# Altium footprint library transistors.PcbLib: 40 footprints (part 1 of 3)
Each footprint in its own frame and in the unit in brackets; x right, y up, seen from the top. Pads: shape width x height; smd on the part's side, far side on the other; paste and mask are expansions set on the pad; w line width, h text height; cw(c..) or ccw(c..) is an arc to the next point about the centre after c.
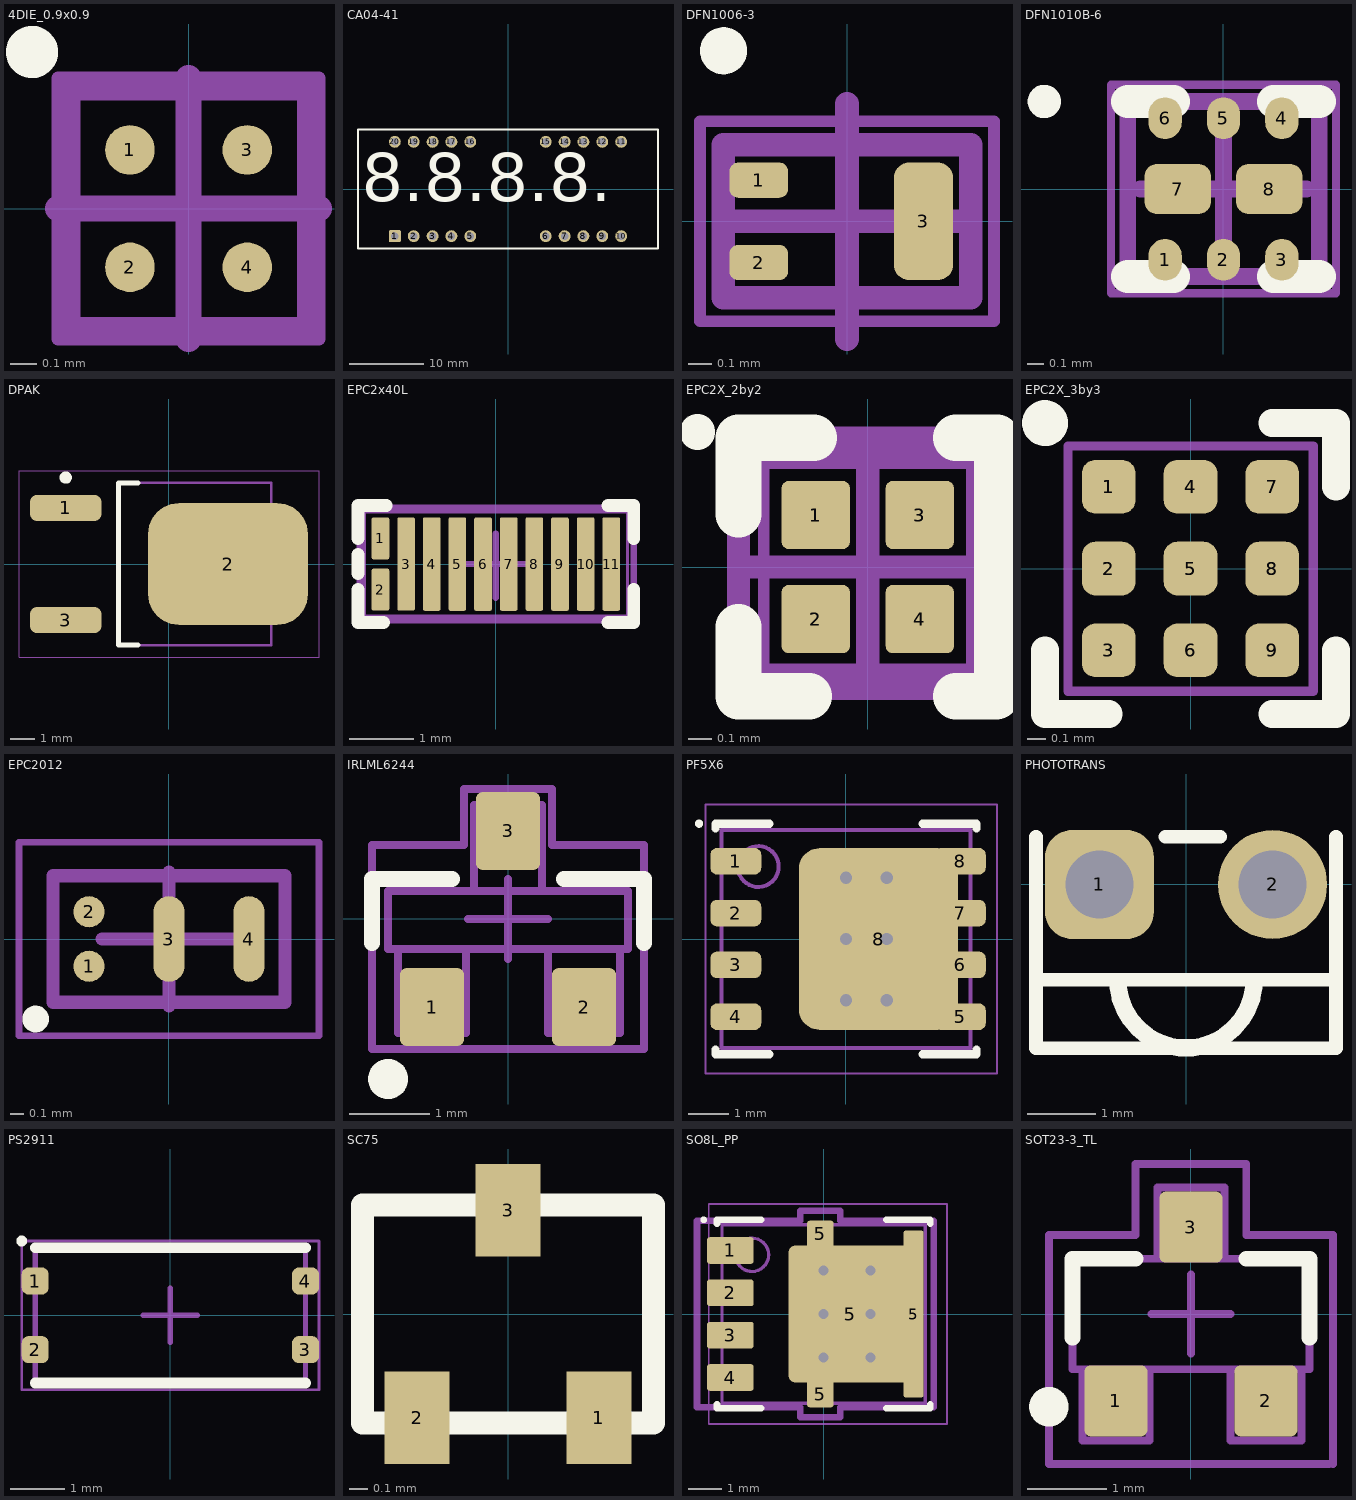
[diagram p0: the footprints below, top view; thin cyan lines are the x and y axes]

## 4DIE_0.9x0.9 [mm] "BGA, 4-Leads, Body 0,93x0,93mmx0,81mm, Pitch 0,45mm"
height 0.82
pads (4):
  round 0.19 smd mask+0.025: 1(-0.225,0.225) 2(-0.225,-0.225) 3(0.225,0.225) 4(0.225,-0.225)
Top Overlay:
  circle w0.1: c-0.6,0.6 r0.05
Mechanical 13:
  lines w0.1: -0.465,-0.465 -0.465,0.465 0.465,0.465 0.465,-0.465 -0.465,-0.465
Mechanical 15:
  lines w0.05: -0.5,-0.5 -0.5,0.5 0.5,0.5 0.5,-0.5 -0.5,-0.5
  lines w0.1: -0.5,0 0.5,0 ; 0,-0.5 0,0.5
3D body: height 0.82, standoff 0.18, extent -0.465,-0.465 0.465,0.465

## CA04-41 [mm] "kingbright 0.4\" QUAD DIGIT RED GREEN YELLOW LED DISPLAY 4-Digit 7-Segment Thru-Hole Display"
height 11.4
pads (20):
  rrect20% 1.6x1.6 hole 1: 1(-15.24,-6.35)
  round 1.6 hole 1: 2(-12.7,-6.35) 3(-10.16,-6.35) 4(-7.62,-6.35) 5(-5.08,-6.35) 6(5.08,-6.35) 7(7.62,-6.35) 8(10.16,-6.35) 9(12.7,-6.35) 10(15.24,-6.35) 11(15.24,6.35) 12(12.7,6.35) 13(10.16,6.35) 14(7.62,6.35) 15(5.08,6.35) 16(-5.08,6.35) 17(-7.62,6.35) 18(-10.16,6.35) 19(-12.7,6.35) 20(-15.24,6.35)
Top Overlay:
  lines w0.254: -20.2,-8 20.2,-8 20.2,8 -20.2,8 -20.2,-8
  text "." at -18.415,-6.985 h11
  text "8.8.8.8." at -19.685,-3.81 h11
M3_comm_top:
  text ".comment" at -3.81,-5.08 h1.52
3D body "King Bright CA04-41.step": height 6.9, standoff -4.1, extent -20.2,-8 20.2,8

## DFN1006-3 [mm] "DFN, 3-Leads, IPC High Density"
height 0.55
pads (3):
  rrect50% 0.25x0.15 smd mask+0.025: 1(-0.375,0.175) 2(-0.375,-0.175)
  rrect50% 0.25x0.5 smd mask+0.025: 3(0.325,0)
Top Overlay:
  circle w0.1: c-0.525,0.725 r0.05
Mechanical 13:
  lines w0.1: -0.525,-0.325 -0.525,0.325 0.525,0.325 0.525,-0.325 -0.525,-0.325
Mechanical 15:
  lines w0.05: -0.625,-0.425 -0.625,0.425 0.625,0.425 0.625,-0.425 -0.625,-0.425
  lines w0.1: -0.5,0 0.5,0 ; 0,-0.5 0,0.5
3D body: height 0.55, standoff 0.05, extent -0.525,-0.325 0.525,0.325

## DFN1010B-6 [mm] "PQFN, 6-Leads, Body 1,15x1,05mm, Pitch 0,35mm, Thermal Pad 0,40x0,30mm, IPC High Density"
height 0.4
pads (8):
  oval 0.2x0.25 smd: 1(-0.35,-0.425) 2(0,-0.425) 3(0.35,-0.425) 4(0.35,0.425) 5(0,0.425) 6(-0.35,0.425)
  rrect50% 0.4x0.3 smd: 7(-0.275,0) 8(0.275,0)
Top Overlay:
  circle w0.1: c-1.075,0.525 r0.05
  lines w0.2: -0.575,-0.525 -0.3,-0.525 ; -0.575,0.525 -0.3,0.525 ; 0.3,-0.525 0.575,-0.525 ; 0.3,0.525 0.575,0.525
Mechanical 13:
  lines w0.1: -0.575,-0.525 -0.575,0.525 0.575,0.525 0.575,-0.525 -0.575,-0.525
Mechanical 15:
  lines w0.05: -0.675,-0.625 -0.675,0.625 0.675,0.625 0.675,-0.625 -0.675,-0.625
  lines w0.1: -0.5,0 0.5,0 ; 0,-0.5 0,0.5
3D body: height 0.4, standoff 0.04, extent -0.575,-0.525 0.575,0.525

## DPAK [mm] "DPAK, IPC"
height 2.4
pads (3):
  rrect50% 2.9x1.05 smd: 1(-4.2,2.28) 3(-4.2,-2.28)
  rrect50% 6.5x4.95 smd: 2(2.4,0)
Top Overlay:
  circle w0.25: c-4.2,3.515 r0.125
  lines w0.2: -1.25,-3.3 -2.05,-3.3 -2.05,3.3 -1.25,3.3
Mechanical 13:
  lines w0.1: -2.05,-3.3 -2.05,3.3 4.15,3.3 4.15,-3.3 -2.05,-3.3
Mechanical 15:
  lines w0.05: -6.1,-3.8 -6.1,3.8 6.1,3.8 6.1,-3.8 -6.1,-3.8
  lines w0.1: -0.5,0 0.5,0 ; 0,-0.5 0,0.5
3D body "User Library-DPAK_TO-252AA.step": height 2.37, standoff -0.03, extent -5.098,-3.367 5.002,3.367

## EPC2x40L [mm]
height 0.8
pads (22):
  rrect20% 0.275x0.655 smd paste-0.048 mask-0.275: 1(-1.8,0.401) 2(-1.8,-0.401)
  rrect20% 0.275x1.457 smd paste-0.048 mask-0.275: 3(-1.4,0) 4(-1,-0.001) 5(-0.6,-0.001) 6(-0.2,-0.001) 7(0.2,-0.001) 8(0.6,-0.001) 9(1,-0.001) 10(1.4,-0.001) 11(1.8,-0.001)
  oval 0.18x0.56 on Top Solder: ""(-1.8,-0.4) ""(-1.8,0.4)
  oval 0.18x1.362 on Top Solder: ""(-1.4,0) ""(-1,0) ""(-0.6,0) ""(-0.2,0) ""(0.2,0) ""(0.6,0) ""(1,0) ""(1.4,0) ""(1.8,0)
Top Overlay:
  lines w0.2: -2.15,-0.4 -2.15,-0.91 -1.75,-0.91 ; -2.15,-0.15 -2.15,0.15 ; -2.15,0.4 -2.15,0.91 -1.71,0.91 ; 1.75,-0.91 2.15,-0.91 2.15,-0.4 ; 1.75,0.91 2.15,0.91 2.15,0.4
M3_comm_top:
  text ".comment" at -1.4,-0.3 h1
M5_asm_top:
  lines w0.1: -2.125,-0.875 2.15,-0.875 2.15,0.875 -2.125,0.875 -2.125,-0.85 -2.125,-0.875
  text ".Designator" at -1.6,0.9 h1
M7_courtyard_top:
  lines w0.1: -0.5,0 0.5,0 ; 0,-0.525 0,0.475 ; -2.125,-0.875 2.15,-0.875 2.15,0.875 -2.125,0.875 -2.125,-0.875
Mechanical 13:
  lines w0.05: -2.052,-0.816 2.053,-0.816 2.053,0.816 -2.052,0.816 -2.052,-0.816
3D body: height 0.81, standoff 0.1, extent -2.052,-0.816 2.053,0.816

## EPC2X_2by2 [mm]
pads (8):
  rrect20% 0.295x0.295 smd paste-0.048 mask+0: 1(-0.225,0.225) 2(-0.225,-0.225) 3(0.225,0.225) 4(0.225,-0.225)
  round 0.2 on Top Solder paste+0 mask+0: 1(-0.225,0.225) 2(-0.225,-0.225) 3(0.225,0.225) 4(0.225,-0.225)
Top Overlay:
  circle w0.152: c-0.738,0.584 r0.001
  lines w0.2: -0.559,-0.559 -0.559,-0.259 ; -0.559,0.229 -0.559,0.559 -0.233,0.559 ; -0.554,-0.559 -0.254,-0.559 ; 0.381,-0.559 0.556,-0.559 ; 0.381,0.559 0.559,0.559 0.559,-0.542
M3_comm_top:
  text ".comment" at -1.4,-0.3 h1
M5_asm_top:
  lines w0.1: -0.559,-0.467 0.476,-0.467 0.518,-0.467 0.518,0.476 -0.559,0.476 -0.559,-0.467
  text ".Designator" at -1.5,0.6 h1
M7_courtyard_top:
  lines w0.1: -0.5,0 0.5,0 ; 0,-0.525 0,0.475 ; -0.559,-0.525 0.559,-0.525 0.559,0.475 0.559,0.559 0.279,0.559 -0.279,0.559 -0.559,0.559 -0.559,0.394 -0.559,-0.409 -0.559,-0.525
Mechanical 13:
  lines w0.05: -0.45,0.447 -0.447,0.45 ; -0.45,-0.45 -0.45,0.45 0.45,0.45 0.45,-0.45 -0.45,-0.45
3D body: height 0.81, standoff 0.17, extent -0.45,-0.45 0.45,0.45

## EPC2X_3by3 [mm]
pads (18):
  rrect50% 0.295x0.295 smd paste-0.048 mask+0: 1(-0.45,0.45) 2(-0.45,0) 3(-0.45,-0.45) 4(0,0.45) 5(0,0) 6(0,-0.45) 7(0.45,0.45) 8(0.45,0) 9(0.45,-0.45)
  round 0.2 on Top Solder paste+0 mask+0: 1(-0.45,0.45) 2(-0.45,0) 3(-0.45,-0.45) 4(0,0.45) 5(0,0) 6(0,-0.45) 7(0.45,0.45) 8(0.45,0) 9(0.45,-0.45)
Top Overlay:
  circle w0.152: c-0.8,0.8 r0.05
  lines w0.152: -0.8,-0.45 -0.8,-0.8 -0.45,-0.8 ; 0.45,-0.8 0.8,-0.8 0.8,-0.45 ; 0.45,0.8 0.8,0.8 0.8,0.45
Mechanical 13:
  lines w0.05: -0.675,-0.675 -0.675,0.675 0.675,0.675 0.675,-0.675 -0.675,-0.675
3D body: height 0.81, standoff 0.17, extent -0.675,-0.675 0.675,0.675

## EPC2012 [mm] "BGA, 6-Leads, Pitch 0,60mm"
height 0.82
pads (4):
  round 0.234 smd: 1(-0.6,-0.205) 2(-0.6,0.205)
  oval 0.234x0.643 smd: 3(0,0) 4(0.6,0)
Top Overlay:
  circle w0.1: c-1,-0.6 r0.05
Mechanical 13:
  lines w0.1: -0.87,-0.475 -0.87,0.475 0.87,0.475 0.87,-0.475 -0.87,-0.475
Mechanical 15:
  lines w0.05: -1.125,-0.725 -1.125,0.725 1.125,0.725 1.125,-0.725 -1.125,-0.725
  lines w0.1: -0.5,0 0.5,0 ; 0,-0.5 0,0.5
3D body: height 0.82, standoff 0.12, extent -0.87,-0.475 0.87,0.475

## IRLML6244 [mm] "MOSFET N-CH 20V 6.3A SOT-23"
height 1.1
pads (3):
  rrect20% 0.802x0.972 smd mask+0.05: 1(-0.95,-1.101) 2(0.95,-1.101) 3(0,1.101)
Top Overlay:
  circle w0.25: c-1.5,-2 r0.125
  lines w0.2: -1.7,-0.3 -1.7,0.5 -0.7,0.5 ; 0.7,0.5 1.7,0.5 1.7,-0.3
M3_comm_top:
  text ".comment" at -1.7,-0.4 h1
M5_asm_top:
  lines w0.1: -1.375,-0.375 -1.375,-1.425 -0.525,-1.425 -0.525,-0.375 ; -0.425,0.35 -0.425,1.425 0.425,1.425 0.425,0.35 ; 0.5,-0.375 0.5,-1.425 1.4,-1.425 1.4,-0.375 ; -1.5,-0.375 -1.5,0.35 1.5,0.35 1.5,-0.375 -1.5,-0.375
  text ".Designator" at -1.05,1.575 h1
M7_courtyard_top:
  lines w0.1: -0.5,0 0.5,0 ; 0,-0.5 0,0.5 ; -1.7,-1.625 1.7,-1.625 1.7,0.925 0.55,0.925 0.55,1.625 -0.55,1.625 -0.55,0.925 -1.7,0.925 -1.7,-1.625
3D body "SOT23-3.step": height 1.3, standoff 0, extent -1.5,-1.5 1.5,1.5

## PF5X6 [mm] "PSON, IPC Medium Density"
height 1.1
pads (9):
  rrect50% 1.25x0.65 smd mask+0: 1(-2.7,1.905) 2(-2.7,0.635) 3(-2.7,-0.635) 4(-2.7,-1.905) 5(2.8,-1.905) 6(2.8,-0.635) 7(2.8,0.635) 8(2.8,1.905)
  rrect25% 3.9x4.45 smd paste-2.575 mask+0: 8(0.8,0)
via 1,-1.5 diameter 0.7 hole 0.3
via 0,-1.5 diameter 0.7 hole 0.3
via 1,0 diameter 0.7 hole 0.3
via 0,0 diameter 0.7 hole 0.3
via 1,1.5 diameter 0.7 hole 0.3
via 0,1.5 diameter 0.7 hole 0.3
Top Overlay:
  circle w0.1: c-3.6,2.825 r0.05
  lines w0.2: -3.2,-2.705 -3.2,-2.825 -1.875,-2.825 ; -3.2,2.705 -3.2,2.825 -1.875,2.825 ; 1.875,-2.825 3.2,-2.825 3.2,-2.705 ; 1.875,2.825 3.2,2.825 3.2,2.705
Top Paste:
  rectangle: -1.05,1.28 0.25,2.26
  rectangle: -1.05,0.1 0.25,1.08
  rectangle: -1.05,-1.08 0.25,-0.1
  rectangle: -1.05,-2.26 0.25,-1.28
  rectangle: 0.425,1.28 1.55,2.26
  rectangle: 0.425,0.1 1.55,1.08
  rectangle: 0.425,-1.08 1.55,-0.1
  rectangle: 0.425,-2.26 1.55,-1.28
Mechanical 13:
  circle w0.1: c-2.15,1.775 r0.5
  lines w0.1: -3.05,-2.675 -3.05,2.675 3.05,2.675 3.05,-2.675 -3.05,-2.675
Mechanical 15:
  lines w0.05: -3.445,-3.3 -3.445,3.3 3.7,3.3 3.7,-3.3 -3.445,-3.3
  lines w0.1: -0.5,0 0.5,0 ; 0,-0.5 0,0.5
3D body "Power_Flat_5x6.step": height 1, standoff 0.01, extent -3.075,-2.6 3.075,2.6

## PHOTOTRANS [mm]
height 0.025
pads (2):
  rrect50% 1.6x1.6 hole 1 mask+0.127: 1(-1.27,0)
  round 1.6 hole 1 mask+0.127: 2(1.27,0)
Top Overlay:
  lines w0.2: -2.2,-1.4 2.2,-1.4 ; -2.2,0.7 -2.2,-2.4 2.2,-2.4 2.2,0.7 ; -0.3,0.7 0.5,0.7
  lines w0.254: -0.995,-1.5 ccw(c0,-1.4) 0.995,-1.5
3D body "SDP8436.stp": height 9.04, standoff -3.54, extent -2.22,-2.415 2.22,0.7

## PS2911 [mm] "KX9A, IPC Medium Density"
height 1
pads (4):
  rrect50% 0.5x0.5 smd: 1(-2.5,0.635) 2(-2.5,-0.635) 3(2.5,-0.635) 4(2.5,0.635)
Top Overlay:
  circle w0.1: c-2.75,1.375 r0.05
  lines w0.2: -2.5,-1.25 2.5,-1.25 ; -2.5,1.25 2.5,1.25
Mechanical 13:
  lines w0.1: -2.5,-1.25 -2.5,1.25 2.5,1.25 2.5,-1.25 -2.5,-1.25
Mechanical 15:
  lines w0.05: -2.75,-1.375 -2.75,1.375 2.75,1.375 2.75,-1.375 -2.75,-1.375
  lines w0.1: -0.5,0 0.5,0 ; 0,-0.5 0,0.5
3D body: height 2.1, standoff 0.01, extent -2.5,-1.25 2.5,1.25

## SC75 [mil]
pads (3):
  rect 14.02x20 smd: 1(19.68,-22.48) 2(-19.68,-22.48) 3(0,22.48)
Top Overlay:
  lines w5: -31.5,-23.62 31.5,-23.62 31.5,23.62 -31.5,23.62 -31.5,-23.62

## SO8L_PP [mm] "SQJ457EP, PSON, IPC Medium Density"
height 1.1
pads (8):
  rrect20% 1.4x0.8 smd mask+0: 1(-2.8,1.905) 2(-2.8,0.635) 3(-2.8,-0.635) 4(-2.8,-1.905)
  rrect20% 0.8x0.8 smd mask+0: 5(-0.1,-2.4) 5(-0.1,2.4)
  rrect10% 3.7x4.1 smd paste-2.575 mask+0: 5(0.8,0)
  rrect20% 0.6x5 smd mask+0: 5(2.7,0)
via 0,1.3 diameter 0.7 hole 0.3
via 1.4,1.3 diameter 0.7 hole 0.3
via 0,0 diameter 0.7 hole 0.3
via 1.4,0 diameter 0.7 hole 0.3
via 0,-1.3 diameter 0.7 hole 0.3
via 1.4,-1.3 diameter 0.7 hole 0.3
Top Overlay:
  circle w0.1: c-3.6,2.825 r0.05
  lines w0.2: -3.2,-2.705 -3.2,-2.825 -1.875,-2.825 ; -3.2,2.705 -3.2,2.825 -1.875,2.825 ; 1.875,-2.825 3.2,-2.825 3.2,-2.705 ; 1.875,2.825 3.2,2.825 3.2,2.705
Top Paste:
  rectangle: 0.425,-2.26 1.55,-1.28
  rectangle: 0.425,-1.08 1.55,-0.1
  rectangle: 0.425,0.1 1.55,1.08
  rectangle: 0.425,1.28 1.55,2.26
  rectangle: -1.05,-2.26 0.25,-1.28
  rectangle: -1.05,-1.08 0.25,-0.1
  rectangle: -1.05,0.1 0.25,1.08
  rectangle: -1.05,1.28 0.25,2.26
M3_comm_top:
  text ".comment" at -2.6,-0.7 h2
M5_asm_top:
  text ".Designator" at -2.1,0.6 h2
M7_courtyard_top:
  lines w0.2: -0.5,0 0.5,0 ; 0,-0.5 0,0.5 ; -3.8,-2.8 -0.7,-2.8 -0.7,-3.1 0.5,-3.1 0.5,-2.8 3.3,-2.8 3.3,2.8 0.5,2.8 0.5,3.1 -0.7,3.1 -0.7,2.8 -3.8,2.8 -3.8,-2.8
Mechanical 13:
  circle w0.1: c-2.15,1.775 r0.5
  lines w0.1: -3.05,-2.675 3.05,-2.675 3.05,2.675 -3.05,2.675 -3.05,-2.675
Mechanical 15:
  lines w0.05: -3.445,-3.3 3.7,-3.3 3.7,3.3 -3.445,3.3 -3.445,-3.3
  lines w0.1: -0.5,0 0.5,0 ; 0,-0.5 0,0.5
3D body "User Library-PowerPAK_SO-8L_SINGLE.STEP": height 1.07, standoff 0, extent -3.255,-2.56 2.895,2.56

## SOT23-3_TL [mm] "IRLML2803, TLV431BSN1T1G, TL431BMFDT,215, IC VREF SHUNT ADJ SOT23-3"
height 1.1
pads (3):
  rrect20% 0.8x0.9 smd mask+0.05: 1(-0.95,-1.1) 2(0.95,-1.1) 3(0,1.1)
Top Overlay:
  circle w0.25: c-1.8,-1.175 r0.125
  lines w0.2: -1.5,-0.3 -1.5,0.7 -0.7,0.7 ; 0.7,0.7 1.5,0.7 1.5,-0.3
M3_comm_top:
  text ".comment" at -1.7,-0.4 h1
M5_asm_top:
  lines w0.1: -1.375,-0.7 -1.375,-1.6 -0.525,-1.6 -0.525,-0.7 ; -0.425,0.7 -0.425,1.6 0.425,1.6 0.425,0.7 ; 0.5,-1.6 0.5,-0.7 ; 0.525,-1.6 1.375,-1.6 ; 1.4,-1.6 1.4,-0.7 ; -1.5,-0.7 1.5,-0.7 1.5,0.7 -1.5,0.7 -1.5,-0.7
  text ".Designator" at -1.9,2 h1
M7_courtyard_top:
  lines w0.1: -0.5,0 0.5,0 ; 0,-0.5 0,0.5 ; 1.75,-1.9 -1.8,-1.9 -1.8,1 -0.7,1 -0.7,1.9 0.7,1.9 0.7,1 1.8,1 1.8,-1.9
3D body "SOT23-3.step": height 1.3, standoff 0, extent -1.5,-1.5 1.5,1.5